# Altium footprint library 10.Modules.PcbLib: 15 footprints
Each footprint in its own frame and in the unit in brackets; x right, y up, seen from the top. Pads: shape width x height; smd on the part's side, far side on the other; paste and mask are expansions set on the pad; w line width, h text height; cw(c..) or ccw(c..) is an arc to the next point about the centre after c.
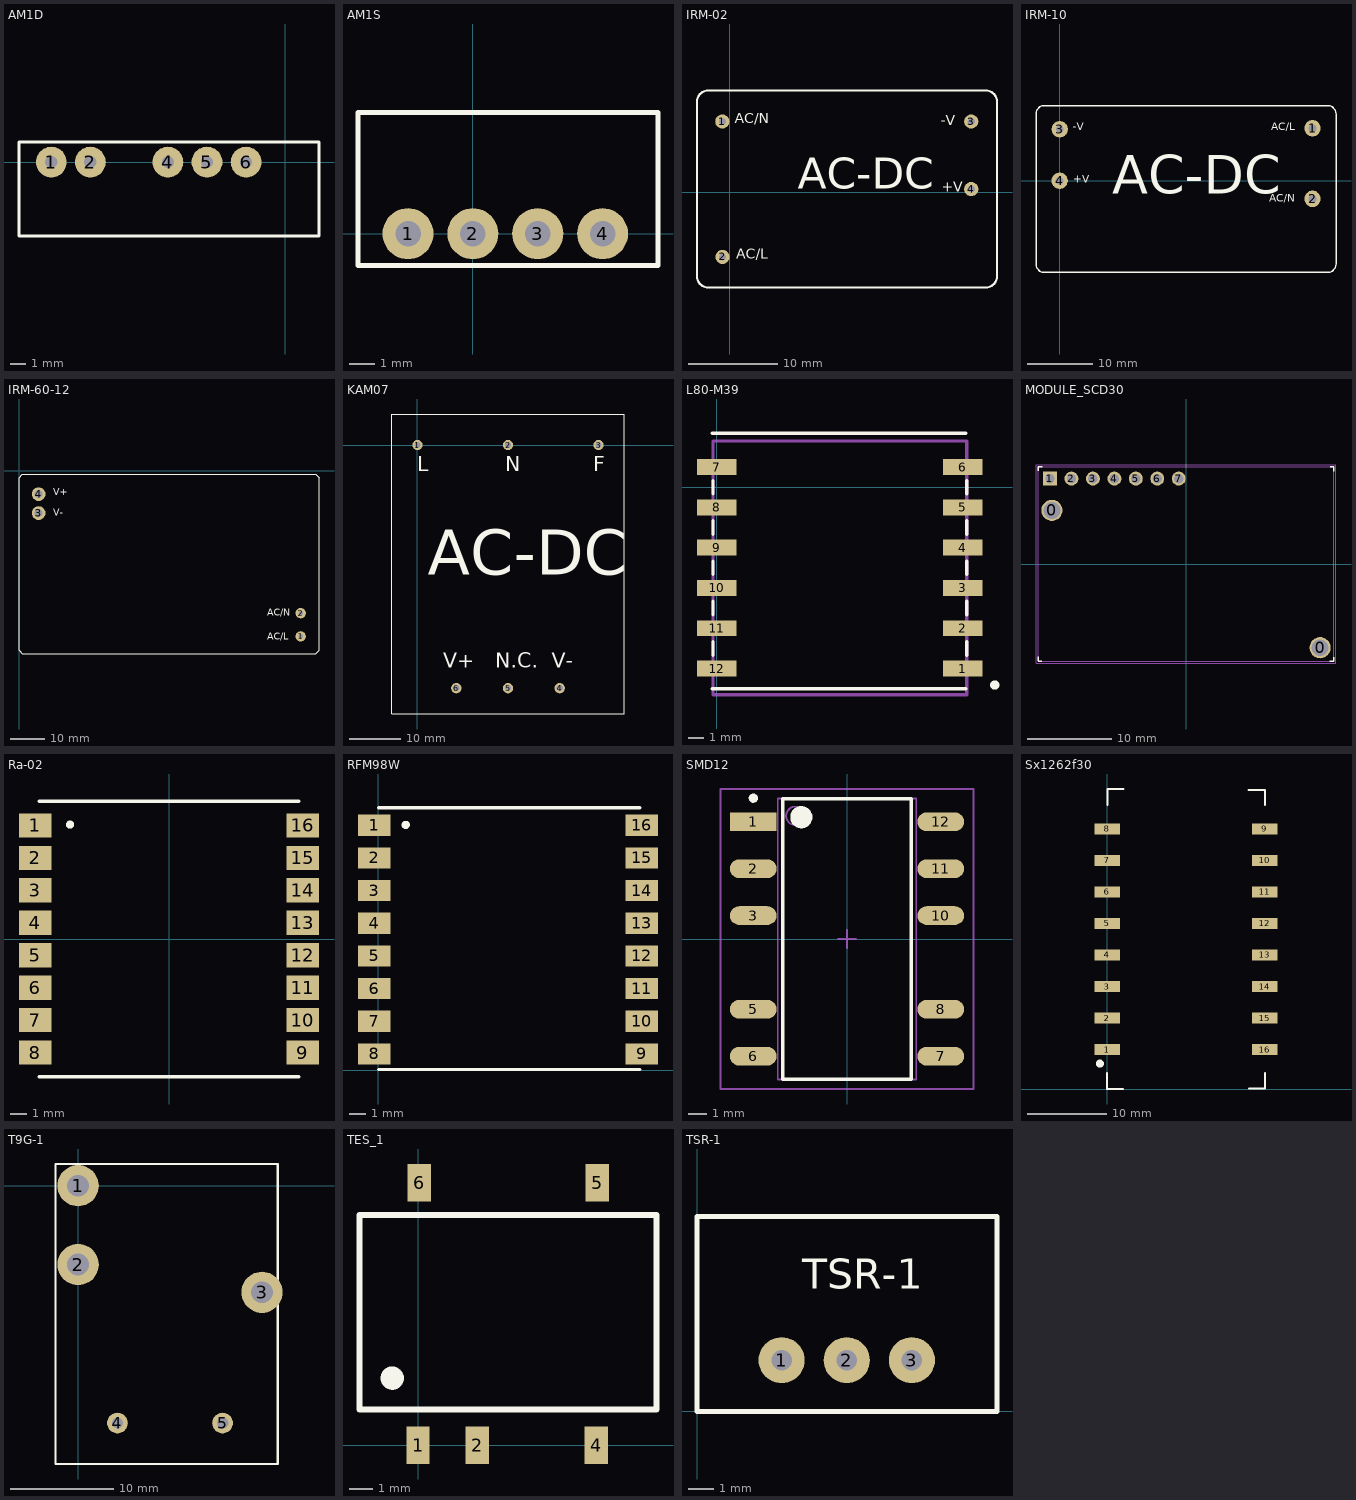
[diagram p0: the footprints below, top view; thin cyan lines are the x and y axes]

## AM1D [mm]
pads (5):
  round 2 hole 0.8: 1(-15.2,0) 2(-12.66,0) 4(-7.62,0) 5(-5.08,0) 6(-2.54,0)
Top Overlay:
  lines w0.2: -17.3,-4.8 -17.3,1.3 2.2,1.3 2.2,-4.8 -17.3,-4.8
3D body "User Library-AM1D-0505S.step": height 10, standoff -3.05, extent -17.3,-4.805 2.2,1.205

## AM1S [mm]
pads (4):
  round 2 hole 1: 1(-2.54,0) 2(0,0) 3(2.54,0) 4(5.08,0)
Top Overlay:
  lines w0.2: -4.5,-1.25 7.25,-1.25 7.25,4.75 -4.5,4.75 -4.5,-1.25
3D body "User Library-AM1S-Z.step": height 10.15, standoff -3.05, extent -4.532,-1.35 7.152,4.75

## IRM-02 [mm]
pads (4):
  round 1.6 hole 0.8: 1(-0.825,7.975) 2(-0.8,-7.25) 3(27.175,7.975) 4(27.175,0.375)
Top Overlay:
  lines w0.25: -2.405,11.475 ccw(c-2.405,10.205) -3.675,10.205 -3.675,-9.43 ccw(c-2.405,-9.43) -2.405,-10.7 28.805,-10.7 ccw(c28.805,-9.43) 30.075,-9.43 30.075,10.205 ccw(c28.805,10.205) 28.805,11.475 -2.35,11.475
  text "AC-DC" at 7.65,-0.75 h6
  text "AC/L" at 0.725,-7.85 h2
  text "AC/N" at 0.575,7.375 h2
  text "-V" at 23.775,7.175 h2
  text "+V" at 23.875,-0.3 h2
3D body "User Library-IRM-02.step": height 15, standoff -3.5, extent -3.675,-10.725 30.025,11.475

## IRM-10 [mm]
pads (4):
  round 2.5 hole 1.2: 1(38.5,7.975) 2(38.5,-2.775) 3(0,7.825) 4(-0.025,-0.025)
Top Overlay:
  lines w0.2: -3.625,-12.775 -3.625,10.125 ; -3.625,-12.705 ccw(c-2.355,-12.705) -2.355,-13.975 ; -3.625,10.155 cw(c-2.355,10.155) -2.355,11.425 ; -2.425,-13.975 40.775,-13.975 ; -2.325,11.425 40.775,11.425 ; 40.805,-13.975 ccw(c40.805,-12.705) 42.075,-12.705 ; 40.805,11.425 cw(c40.805,10.155) 42.075,10.155 42.075,9.425 ; 42.075,-12.675 42.075,10.125
  text "+V" at 2.075,-0.675 h2
  text "-V" at 1.975,7.325 h2
  text "AC/N" at 31.875,-3.575 h2
  text "AC/L" at 32.175,7.325 h2
  text "AC-DC" at 8,-3.9 h10
3D body "User Library-IRM-10-12.step": height 22.25, standoff -3.3, extent -3.6,-14 42.099,11.4

## IRM-60-12 [mm]
pads (4):
  round 3 hole 1.3: 1(81.7,-48) 2(81.7,-41.25)
  round 4 hole 2.3: 3(5.7,-12.25) 4(5.7,-6.75)
Top Overlay:
  lines w0.15: 0,-52 1,-53 86,-53 87,-52 87,-2 86,-1 1,-1 0,-2 0,-52
  text "AC/N" at 72,-42 h2
  text "AC/L" at 72,-49 h2
  text "V-" at 10,-13 h2
  text "V+" at 10,-7 h2
3D body "User Library-MEAN-WELL, IRM-60-24.step": height 29.5, standoff -3.5, extent 0,-53 87,-1

## KAM07 [mm]
pads (6):
  round 2 hole 1.2: 1(0,0) 2(17.5,0) 3(35,0) 4(27.5,-47) 5(17.5,-47) 6(7.5,-47)
Top Overlay:
  lines w0.2: -5,-52 40,-52 40,6 -5,6 -5,-52
  text "AC-DC" at 2,-28 h15
  text "N.C." at 15,-44 h5
  text "V+" at 5,-44 h5
  text "V-" at 26,-44 h5
  text "F" at 34,-6 h5
  text "N" at 17,-6 h5
  text "L" at 0,-6 h5
3D body: height 18.5, standoff 0.1, extent -5,-52 40,6

## L80-M39 [mm]
pads (12):
  rect 2.5x1 smd: 1(15.5,-11.43) 2(15.5,-8.89) 3(15.5,-6.35) 4(15.5,-3.81) 5(15.5,-1.27) 6(15.5,1.27) 7(0,1.27) 8(0,-1.27) 9(0,-3.81) 10(0,-6.35) 11(0,-8.89) 12(0,-11.43)
Top Overlay:
  circle w0.3: c17.511,-12.465 r0.142
  lines w0.2: -0.3,-12.7 15.7,-12.7 ; -0.3,3.4 15.7,3.4 ; -0.25,-10.59 -0.25,-9.73 ; -0.25,-8.05 -0.25,-7.19 ; -0.25,-5.51 -0.25,-4.65 ; -0.25,-2.97 -0.25,-2.11 ; -0.25,-0.43 -0.25,0.43 ; 15.75,-10.59 15.75,-9.73 ; 15.75,-8.05 15.75,-7.19 ; 15.75,-5.51 15.75,-4.65 ; 15.75,-2.97 15.75,-2.11 ; 15.75,-0.43 15.75,0.43
Mechanical 13:
  lines w0.2: -0.25,-13.08 -0.25,2.92 15.75,2.92 15.75,-13.08 -0.25,-13.08
3D body "User Library-L80-1.step": height 6.81, standoff -0.19, extent -0.31,-12.6 15.71,3.4

## MODULE_SCD30 [mm]
pads (9):
  round 2.5 hole 2: 0(-15.875,6.35) 0(15.875,-9.906)
  rect 1.65x1.65 hole 1.1: 1(-16.1,10.1)
  round 1.65 hole 1.1: 2(-13.56,10.1) 3(-11.02,10.1) 4(-8.48,10.1) 5(-5.94,10.1) 6(-3.4,10.1) 7(-0.86,10.1)
Top Overlay:
  lines w0.15: -17.507,-11.491 -17.056,-11.491 ; -17.507,-11.478 -17.507,-10.983 ; -17.503,11.049 -17.503,11.5 -17.477,11.5 ; -17.49,11.5 -16.995,11.5 ; 16.999,-11.5 17.494,-11.5 ; 17.05,11.507 17.501,11.507 ; 17.501,10.999 17.501,11.494 ; 17.507,-11.5 17.507,-11.049
Mechanical 13:
  lines w0.127: -17.5,-11.5 17.5,-11.5 17.5,11.5 -17.5,11.5 -17.5,-11.5
Mechanical 15:
  lines w0.05: -17.75,-11.75 17.75,-11.75 17.75,11.75 -17.75,11.75 -17.75,-11.75
3D body "SCD30--3DModel-STEP-56544.STEP": height 15.45, standoff 8.45, extent -17.5,-11.5 17.5,11.5

## Ra-02 [mm]
pads (16):
  rect 2x1.5 smd: 1(-8.25,7) 2(-8.25,5) 3(-8.25,3) 4(-8.25,1) 5(-8.25,-1) 6(-8.25,-3) 7(-8.25,-5) 8(-8.25,-7) 9(8.25,-7) 10(8.25,-5) 11(8.25,-3) 12(8.25,-1) 13(8.25,1) 14(8.25,3) 15(8.25,5) 16(8.25,7)
Top Overlay:
  circle w0.25: c-6.1,7.05 r0.125
  lines w0.2: -8,-8.5 8,-8.5 ; -8,8.5 8,8.5
3D body "User Library-RA-02.step": height 3.2, standoff 0, extent -8.085,-8.458 7.915,8.542

## RFM98W [mm]
pads (16):
  rect 2x1.3 smd: 1(-0.25,15) 2(-0.25,13) 3(-0.25,11) 4(-0.25,9) 5(-0.25,7) 6(-0.25,5) 7(-0.25,3) 8(-0.25,1) 9(16.125,1) 10(16.125,3) 11(16.125,5) 12(16.125,7) 13(16.125,9) 14(16.125,11) 15(16.125,13) 16(16.125,15)
Top Overlay:
  circle w0.25: c1.675,15.025 r0.125
  lines w0.2: 0,0.05 16,0.05 ; 0,16.075 16,16.075
3D body "RFM95 LoRa v15.step": height 2.04, standoff 0, extent -0.018,-0.028 15.982,15.972

## SMD12 [mil] "MD12, 12-Leads, Body 15,2x7,5mm (max), Pitch 2,54mm, IPC Medium Density"
height 255.91
pads (10):
  rect 100x40 smd: 1(-200,250)
  oval 100x40 smd: 2(-200,150) 3(-200,50) 5(-200,-150) 6(-200,-250) 7(200,-250) 8(200,-150) 10(200,50) 11(200,150) 12(200,250)
Top Overlay:
  circle w9.84: c-199.88,300.42 r4.92
  circle w23.62: c-97.44,259.84 r11.81
  lines w7.87: -136.81,-299.21 -136.81,299.21 136.81,299.21 136.81,-299.21 -136.81,-299.21
Mechanical 13:
  circle w3.94: c-110.24,262.6 r19.68
  lines w3.94: -147.64,-300 -147.64,300 147.64,300 147.64,-300 -147.64,-300
Mechanical 15:
  lines w3.94: -19.68,0 19.69,0 ; 0,-19.68 0,19.68 ; -270,-320 -270,320 270,320 270,-320 -270,-320
3D body "AM1L.STEP": height 255.51, standoff 0.02, extent -221.04,-300 221.04,300

## Sx1262f30 [mm]
pads (16):
  rect 3.2x1.4 smd: 1(0,5) 2(0,9) 3(0,13) 4(0,17) 5(0,21) 6(0,25) 7(0,29) 8(0,33) 9(20,33) 10(20,29) 11(20,25) 12(20,21) 13(20,17) 14(20,13) 15(20,9) 16(20,5)
Top Overlay:
  circle w0.5: c-0.916,3.225 r0.25
  lines w0.25: 0,2 0,0 2,0 ; 0.058,36 0.058,38 ; 0.058,38.058 2.058,38.058 ; 17.942,37.942 20,37.942 20,36 ; 18,0.058 20,0.058 20,2.058
3D body: height 1.5, standoff 0, extent 0,0 20,38
3D body: height 4, standoff 0, extent 2,2 18,36

## T9G-1 [mm]
pads (5):
  round 4 hole 2.1: 1(0,0) 2(0,-7.62) 3(17.78,-10.3)
  round 2 hole 1.1: 4(3.81,-22.94) 5(13.97,-22.94)
Top Overlay:
  lines w0.2: -2.2,-26.9 -2.2,2.1 19.3,2.1 19.3,-26.9 -2.2,-26.9
3D body: height 15.7, standoff 0, extent -2.2,-26.9 19.3,2.1

## TES_1 [mm]
pads (5):
  rect 1x1.6 smd: 1(0,0) 2(2.54,0) 4(7.62,0) 5(7.67,11.235) 6(0.05,11.235)
Top Overlay:
  circle w0.5: c-1.1,2.875 r0.25
  lines w0.254: -1,1.525 10.2,1.525 10.2,9.85 -0.9,9.85 ; -0.925,1.525 -2.5,1.525 -2.5,9.85 -0.875,9.85
3D body "User Library-B_XT-1WR2.STEP": height 7.25, standoff 0, extent -2.5,0 10.2,11.2

## TSR-1 [mm]
pads (3):
  round 1.8 hole 0.8: 1(3.3,2) 2(5.84,2) 3(8.38,2)
Top Overlay:
  lines w0.2: 0,0 0,7.6 11.7,7.6 11.7,0 0,0
  text "TSR-1" at 4.1,4.4 h2
3D body "User Library-Traco TRS 1-2450.step": height 10.2, standoff -4.1, extent 0.05,-0.115 11.75,7.5